# Altium footprint library MainFPs.PcbLib: 206 footprints (part 3 of 13)
Each footprint in its own frame and in the unit in brackets; x right, y up, seen from the top. Pads: shape width x height; smd on the part's side, far side on the other; paste and mask are expansions set on the pad; w line width, h text height; cw(c..) or ccw(c..) is an arc to the next point about the centre after c.
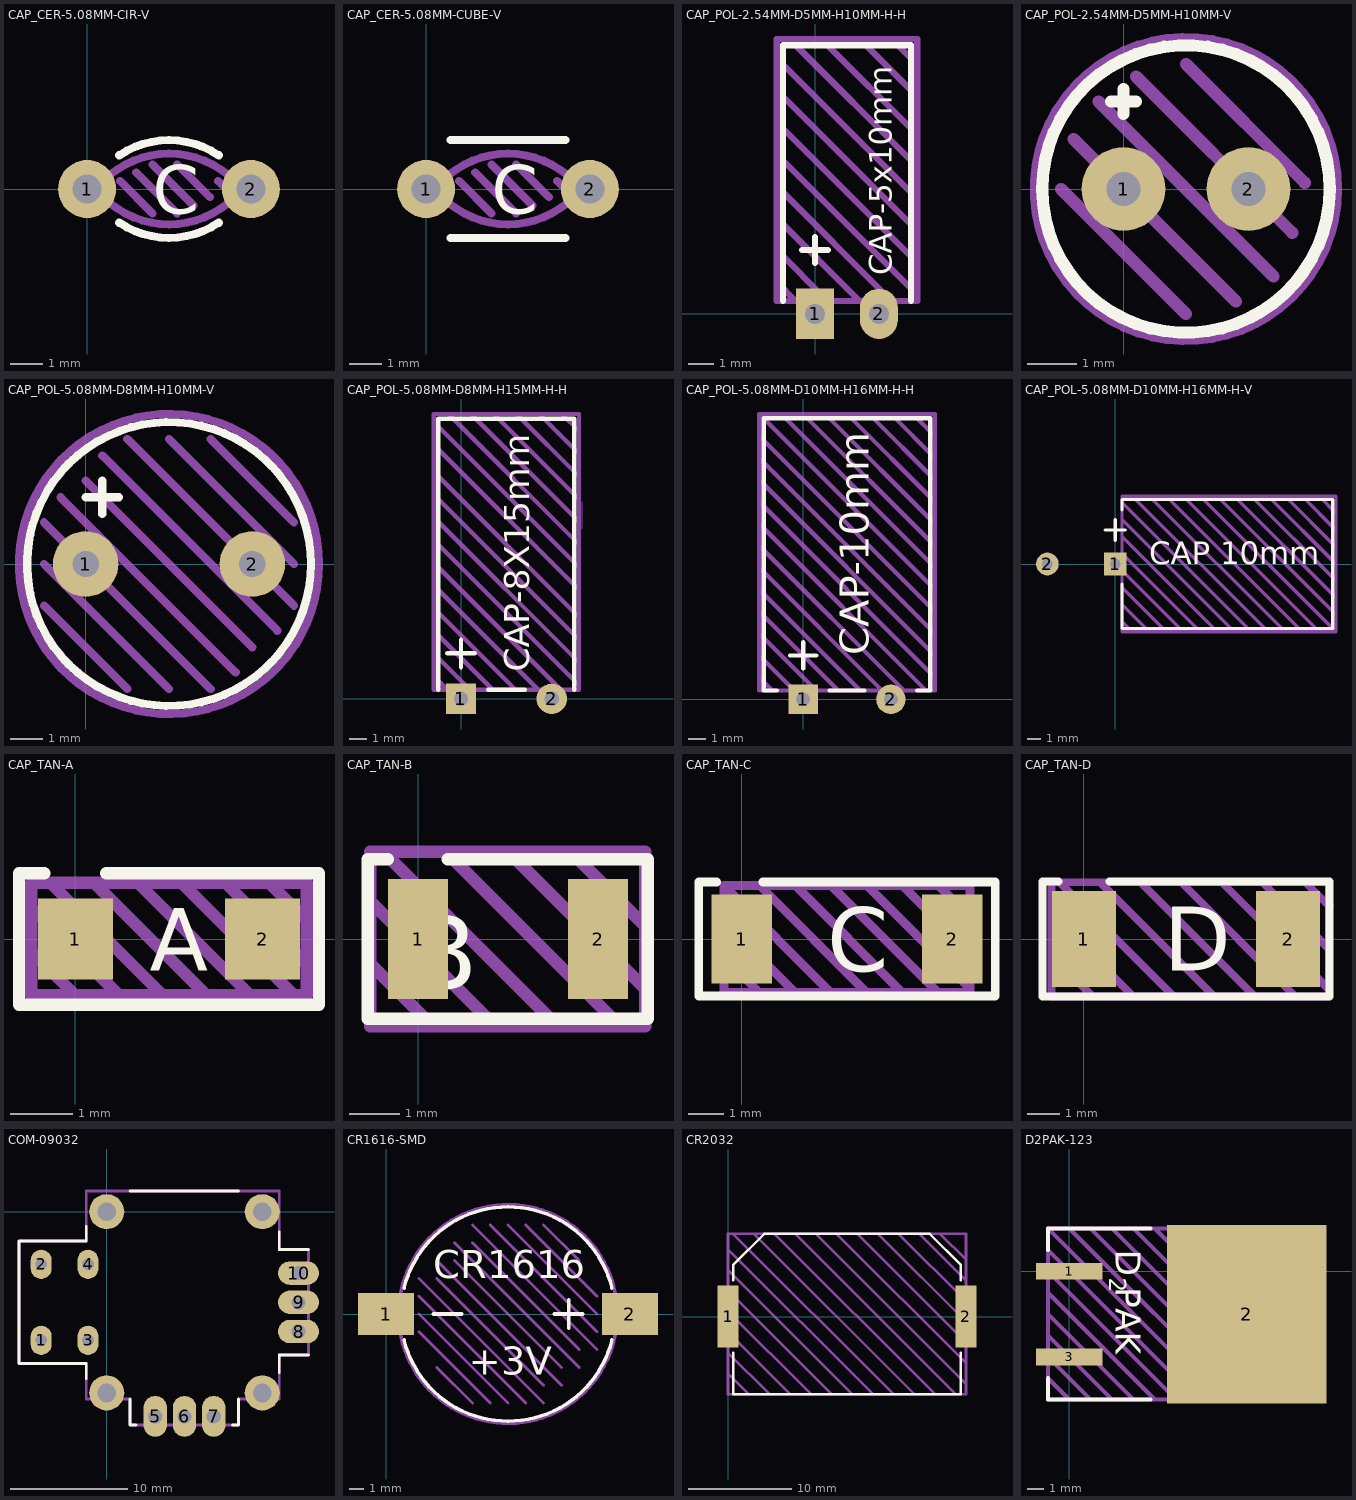
[diagram p2: the footprints below, top view; thin cyan lines are the x and y axes]

## CAP_CER-5.08MM-CIR-V [mm]
pads (2):
  round 1.8 hole 0.9: 1(0,0) 2(5.08,0)
Top Overlay:
  lines w0.25: 0.996,-1.046 ccw(c2.54,1.27) 4.084,-1.046 ; 0.996,1.046 cw(c2.54,-1.27) 4.084,1.046
  text "C" at 2.032,-0.762 h1.5
Draw:
  lines w0.25: 0.508,-0.254 ccw(c2.54,1.778) 4.572,-0.254 ; 0.508,0.254 cw(c2.54,-1.778) 4.572,0.254 ; 1.016,0.254 2.032,-0.762 ; 1.524,0.508 2.794,-0.762 ; 2.032,0.762 3.302,-0.508 ; 2.794,0.762 3.81,-0.254 ; 4.064,0.254 4.318,0
Info:
  text "'.Comment'" at -0.508,-2.54 h0.75
3D body: height 1.91, standoff 1.39, extent 3.841,-0.26 4.441,0.26
3D body: height 7.37, standoff 1.27, extent -0.508,-0.508 5.588,0.508
3D body: height 1.89, standoff -0.13, extent -0.232,-0.254 1.224,0.254
3D body: height 1.89, standoff -0.13, extent 3.856,-0.255 5.312,0.253
3D body: height 0, standoff -1.78, extent 4.825,-0.254 5.333,0.254
3D body: height 0, standoff -1.78, extent -0.254,-0.254 0.254,0.254
3D body: height 0.25, standoff -0.25, extent 4.825,-0.254 5.333,0.254
3D body: height 0.25, standoff -0.25, extent -0.266,-0.254 0.242,0.254
3D body: height 1.91, standoff 1.39, extent 0.639,-0.26 1.239,0.26

## CAP_CER-5.08MM-CUBE-V [mm]
pads (2):
  round 1.8 hole 0.9: 1(0,0) 2(5.08,0)
Top Overlay:
  lines w0.25: 0.762,-1.524 4.318,-1.524 ; 0.762,1.524 4.318,1.524
  text "C" at 2.032,-0.762 h1.5
Draw:
  lines w0.25: 0.508,-0.254 ccw(c2.54,1.778) 4.572,-0.254 ; 0.508,0.254 cw(c2.54,-1.778) 4.572,0.254 ; 1.016,0.254 2.032,-0.762 ; 1.524,0.508 2.794,-0.762 ; 2.032,0.762 3.302,-0.508 ; 2.794,0.762 3.81,-0.254 ; 4.064,0.254 4.318,0
Info:
  text "'.Comment'" at -0.381,-2.54 h0.75
3D body: height 3.8, standoff 3.3, extent 1.238,-0.261 1.758,0.259
3D body: height 3.8, standoff 3.3, extent 3.32,-0.26 3.84,0.26
3D body: height 6.17, standoff 3.63, extent 0.8,-0.64 4.28,0.66
3D body: height 4.23, standoff 2.73, extent 1.245,-0.255 1.753,0.253
3D body: height 4.23, standoff 2.73, extent 3.326,-0.254 3.834,0.254
3D body: height 0.25, standoff -0.25, extent -0.266,-0.254 0.242,0.254
3D body: height 0.25, standoff -0.25, extent 4.825,-0.254 5.333,0.254
3D body: height 0, standoff -1.78, extent -0.254,-0.254 0.254,0.254
3D body: height 0, standoff -1.78, extent 4.825,-0.254 5.333,0.254
3D body: height 2.83, standoff -0.12, extent 3.367,-0.255 5.314,0.253
3D body: height 2.83, standoff -0.12, extent -0.234,-0.254 1.713,0.254
3D body: height 2.98, standoff 2.48, extent 3.328,-0.254 3.836,0.254
3D body: height 2.98, standoff 2.48, extent 1.245,-0.255 1.753,0.253

## CAP_POL-2.54MM-D5MM-H10MM-H-H [mm]
pads (2):
  rect 1.5x2 hole 0.8: 1(0,0)
  oval 1.5x2 hole 0.8: 2(2.54,0)
Top Overlay:
  lines w0.25: -1.27,0.508 -1.27,10.668 3.81,10.668 3.81,0.508 ; -0.508,2.54 0.508,2.54 ; 0,2.032 0,3.048
  text "CAP-5x10mm" at 3.048,1.524 h0.9
Draw:
  lines w0.25: -1.524,1.27 -0.762,0.508 ; -1.524,2.54 0.508,0.508 ; -1.524,3.81 1.778,0.508 ; -1.524,5.08 3.048,0.508 ; -1.524,6.35 4.064,0.762 ; -1.524,7.62 4.064,2.032 ; -1.524,8.89 4.064,3.302 ; -1.524,10.16 4.064,4.572 ; -1.016,10.922 4.064,5.842 ; -0.508,0.508 0.762,0.508 ; 0.254,10.922 4.064,7.112 ; 1.778,10.922 4.064,8.636 4.064,8.128 ; 2.032,0.508 3.81,0.508 ; 2.54,0.508 0.762,0.508 ; 3.048,10.922 4.064,9.906 ; 3.302,0.508 4.064,0.508 4.064,10.922 -1.524,10.922 -1.524,0.508 0.762,0.508
Info:
  text "'.Comment'" at -1.651,-2.413 h1
3D body: height 3.33, standoff 1.67, extent 3.344,10.453 3.86,10.953
3D body: height 5, standoff 0, extent -1.187,0.668 3.813,1.168
3D body: height 4.9, standoff 0.1, extent -1.087,10.812 3.713,10.842
3D body: height 5.01, standoff -0.01, extent -1.197,10.45 3.823,10.95
3D body: height 5, standoff 0, extent -1.187,10.812 3.813,10.912
3D body: height 2.75, standoff 2.25, extent 3.911,7.112 3.952,10.112
3D body: height 2.75, standoff 2.25, extent -0.254,0 0.254,1.27
3D body: height 5.01, standoff -0.01, extent -1.197,0.842 3.823,10.812
3D body: height 2.5, standoff -1.78, extent 2.286,-0.254 2.794,0.254
3D body: height 2.5, standoff -1.78, extent -0.254,-0.254 0.254,0.254
3D body: height 2.75, standoff 2.25, extent 2.286,-0.254 2.794,0.254
3D body: height 2.75, standoff 2.25, extent -0.254,-0.254 0.254,0.254
3D body: height 2.75, standoff 2.25, extent 2.286,0 2.794,1.27
3D body: height 2.75, standoff 2.25, extent 3.911,1.93 3.952,4.93
3D body: height 2.5, standoff 0.48, extent 1.231,0.75 3.132,1.25
3D body: height 4.52, standoff 2.5, extent 1.231,0.75 3.132,1.25
3D body: height 4.52, standoff 2.5, extent -0.587,0.75 1.313,1.25
3D body: height 2.5, standoff 0.48, extent -0.587,0.75 1.313,1.25
3D body: height 3.34, standoff 1.66, extent 3.691,0.66 3.844,10.66
3D body: height 3.33, standoff 1.67, extent 3.327,0.66 3.844,0.86

## CAP_POL-2.54MM-D5MM-H10MM-V [mm]
pads (2):
  round 1.7 hole 0.7: 1(0,0) 2(2.54,0)
Top Overlay:
  circle w0.25: c1.27,0 r2.921
  lines w0.25: -0.254,1.778 0.254,1.778 ; 0,1.524 0,2.032
Draw:
  circle w0.25: c1.27,0 r3.048
  lines w0.25: -1.27,0 1.27,-2.54 ; -1.016,1.016 2.286,-2.286 ; -0.508,1.778 3.048,-1.778 ; 0.254,2.286 3.429,-0.889 ; 1.27,2.54 3.683,0.127
Info:
  text "'.Comment'" at -2.032,-4.318 h1
3D body: height 10.97, standoff 10.9, extent -1.03,-2.3 3.57,2.3
3D body: height 10.92, standoff 0.89, extent 3.81,-0.762 3.836,0.762
3D body: height 10.92, standoff 0.76, extent -1.27,-2.54 3.81,2.54
3D body: height 0.79, standoff -1.78, extent 2.286,-0.254 2.794,0.254
3D body: height 0.79, standoff -1.78, extent -0.254,-0.254 0.254,0.254
3D body: height 10.16, standoff 8.89, extent 3.848,-0.127 3.874,0.127
3D body: height 5.08, standoff 3.81, extent 3.848,-0.127 3.874,0.127
3D body: height 7.62, standoff 6.35, extent 3.848,-0.127 3.874,0.127
3D body: height 2.54, standoff 1.27, extent 3.848,-0.127 3.874,0.127
3D body: height 11, standoff 10.95, extent -1.016,-2.286 3.556,2.286

## CAP_POL-5.08MM-D8MM-H10MM-V [mm]
pads (2):
  round 2 hole 0.8: 1(0,0) 2(5.08,0)
Top Overlay:
  circle w0.25: c2.54,0 r4.325
  lines w0.25: 0.508,2.54 0.508,1.524 0.508,2.032 0,2.032 1.016,2.032
Draw:
  circle w0.25: c2.54,0 r4.572
  lines w0.25: -1.27,-1.27 1.27,-3.81 ; -1.27,0 2.54,-3.81 ; -1.27,1.27 3.81,-3.81 ; -0.762,2.032 4.572,-3.302 ; 0,2.54 5.08,-2.54 ; 0.508,3.302 5.842,-2.032 ; 1.27,3.81 6.35,-1.27 ; 2.54,3.81 6.35,0 ; 3.81,3.81 6.35,1.27
Info:
  text "'.Comment'" at -1.778,-5.715 h1
3D body: height 2.54, standoff 1.27, extent 6.642,-0.127 6.668,0.127
3D body: height 7.62, standoff 6.35, extent 6.642,-0.127 6.668,0.127
3D body: height 5.08, standoff 3.81, extent 6.642,-0.127 6.668,0.127
3D body: height 12.7, standoff 11.43, extent 6.642,-0.127 6.668,0.127
3D body: height 10.16, standoff 8.89, extent 6.642,-0.127 6.668,0.127
3D body: height 0.79, standoff -1.78, extent -0.254,-0.254 0.254,0.254
3D body: height 0.79, standoff -1.78, extent 4.826,-0.254 5.334,0.254
3D body: height 13.61, standoff 13.56, extent -1.143,-3.683 6.223,3.683
3D body: height 13.46, standoff 0.76, extent -1.524,-4.064 6.604,4.064
3D body: height 13.33, standoff 0.89, extent 6.604,-1.016 6.629,1.016
3D body: height 13.59, standoff 13.44, extent -1.143,-3.683 6.223,3.683

## CAP_POL-5.08MM-D8MM-H15MM-H-H [mm]
pads (2):
  rect 1.7x1.7 hole 0.8: 1(0,0)
  round 1.7 hole 0.8: 2(5.08,0)
Top Overlay:
  lines w0.25: -1.27,0.508 -1.27,15.686 6.35,15.686 6.35,0.508 ; -0.762,2.54 0.762,2.54 ; 0,1.778 0,2.54 0,3.302 ; 1.524,0.508 3.556,0.508
  text "CAP-8X15mm" at 3.81,1.524 h1.4
Draw:
  lines w0.025: 6.785,9.529 6.785,11.03
  lines w0.25: -1.524,1.27 -0.762,0.508 ; -1.524,2.54 0.508,0.508 ; -1.524,3.81 1.778,0.508 ; -1.524,5.08 3.048,0.508 ; -1.524,6.35 4.318,0.508 ; -1.524,7.62 5.588,0.508 ; -1.524,8.89 6.604,0.762 ; -1.524,10.16 6.604,2.032 ; -1.524,11.43 6.604,3.302 ; -1.524,12.7 6.604,4.572 ; -1.493,14.193 6.604,6.096 ; -1.493,15.463 6.604,7.366 ; -0.666,15.906 6.604,8.636 ; -0.508,0.508 0.762,0.508 ; 0.604,15.906 6.604,9.906 ; 1.874,15.906 6.604,11.176 ; 2.032,0.508 3.81,0.508 ; 2.54,0.508 0.762,0.508 ; 3.302,0.508 6.604,0.508 ; 4.38,15.94 6.604,13.716 ; 4.572,0.508 6.604,0.508 ; 5.684,15.906 6.604,14.986 ; 0.762,0.508 -1.524,0.508 -1.524,15.94 6.604,15.94 6.604,0.508 ; 3.144,15.906 6.604,12.446 3.144,15.906
Info:
  text "'.Comment'" at -1.521,-2.602 h1.25
3D body: height 8, standoff 0, extent -1.46,0.588 6.54,15.588
3D body: height 6.53, standoff 1.47, extent 5.65,0.59 6.55,15.54
3D body: height 4.2, standoff 3.8, extent 6.525,6.003 6.575,9.503
3D body: height 7.7, standoff 3.7, extent 2.54,0.438 5.818,0.738
3D body: height 7.7, standoff 3.7, extent -0.738,0.438 2.54,0.738
3D body: height 4.3, standoff 0.3, extent 2.54,0.438 5.818,0.738
3D body: height 4.3, standoff 0.3, extent -0.738,0.438 2.54,0.738
3D body: height 7.9, standoff 0.1, extent -1.36,15.495 6.44,15.595
3D body: height 7.6, standoff 0.4, extent -1.06,15.41 6.14,15.71
3D body: height 8, standoff 0, extent -1.46,15.25 6.54,15.75
3D body: height 6.54, standoff 1.46, extent 4.729,15.475 6.551,15.775
3D body: height 6.54, standoff 1.46, extent 4.728,0.325 6.55,0.625
3D body: height 4.3, standoff 3.7, extent 4.781,-0.047 5.381,1.223
3D body: height 4.3, standoff 3.7, extent -0.3,-0.3 0.3,0.3
3D body: height 4.3, standoff 3.7, extent 4.78,-0.3 5.38,0.3
3D body: height 4, standoff -1.78, extent -0.3,-0.3 0.3,0.3
3D body: height 4, standoff -1.78, extent 4.78,-0.3 5.38,0.3
3D body: height 4.3, standoff 3.7, extent -0.3,0 0.3,1.27
3D body: height 4.2, standoff 3.8, extent 6.525,1.005 6.575,4.505
3D body: height 8, standoff 0, extent -1.469,0.35 6.531,0.85
3D body: height 4.2, standoff 3.8, extent 6.525,11.033 6.575,14.533

## CAP_POL-5.08MM-D10MM-H16MM-H-H [mm]
pads (2):
  rect 1.7x1.7 hole 0.8: 1(0,0)
  round 1.7 hole 0.8: 2(5.08,0)
Top Overlay:
  lines w0.25: -1.524,0.508 -2.286,0.508 -2.286,16.256 7.366,16.256 7.366,0.508 6.604,0.508 ; -0.762,2.54 0.762,2.54 ; 0,1.778 0,2.54 0,3.302 ; 1.524,0.508 3.556,0.508
  text "CAP-10mm" at 3.81,2.54 h1.7
Draw:
  lines w0.25: -2.54,1.27 -1.778,0.508 0,0.508 -0.508,0.508 -2.54,2.54 ; -2.54,3.81 0.762,0.508 2.54,0.508 ; -2.54,5.08 2.032,0.508 3.81,0.508 ; -2.54,6.35 3.302,0.508 5.08,0.508 4.572,0.508 -2.54,7.62 ; -2.54,8.89 5.842,0.508 7.62,0.508 ; -2.54,10.16 7.112,0.508 7.62,0.508 ; -2.54,11.43 7.62,1.27 7.62,0.508 ; -2.54,12.7 7.62,2.54 ; -2.54,13.97 7.62,3.81 7.62,5.08 -2.54,15.24 ; -1.27,16.51 7.62,7.62 ; 0,16.51 7.62,8.89 7.62,6.35 ; 1.27,16.51 7.62,10.16 ; 2.54,16.51 7.62,11.43 7.62,12.7 3.81,16.51 ; 5.08,16.51 7.62,13.97 ; 6.35,16.51 7.62,15.24 ; 7.62,6.985 7.62,7.62 ; -2.54,16.51 7.62,6.35 ; -2.54,16.51 -2.54,0.508 7.62,0.508 ; -2.54,16.51 7.62,16.51 7.62,16.256 7.62,0.508 ; 7.62,6.35 7.62,7.62
Info:
  text "'.Comment'" at -2.286,-2.54 h1.25
3D body: height 5.2, standoff 4.8, extent 7.595,3.81 7.645,8.89
3D body: height 5.2, standoff 4.8, extent 7.595,0.508 7.645,2.54
3D body: height 9, standoff 1, extent 2.24,16.18 2.84,16.28
3D body: height 5.3, standoff 4.7, extent -1.524,16.231 6.604,16.281
3D body: height 7, standoff 3, extent 6.604,0.508 7.62,0.635
3D body: height 7, standoff 3, extent 7.366,0.588 7.62,16.002
3D body: height 5.25, standoff 4.75, extent -0.253,0 0.255,1.27
3D body: height 10, standoff 0, extent -2.46,0.588 7.54,16.088
3D body: height 5, standoff -1.78, extent 4.826,-0.254 5.334,0.254
3D body: height 5, standoff -1.78, extent -0.254,-0.254 0.254,0.254
3D body: height 5.25, standoff 4.75, extent 4.826,-0.254 5.334,0.254
3D body: height 5.25, standoff 4.75, extent -0.254,-0.254 0.254,0.254
3D body: height 5.25, standoff 4.75, extent 4.827,-0.047 5.335,1.223
3D body: height 9.5, standoff 0.5, extent -1.96,16.002 7.04,16.256
3D body: height 5.2, standoff 4.8, extent 7.595,10.16 7.645,15.24
3D body: height 5.2, standoff 4.8, extent 6.858,0.483 7.645,0.533
3D body: height 9, standoff 1, extent -1.46,0.483 6.54,0.783

## CAP_POL-5.08MM-D10MM-H16MM-H-V [mm]
pads (2):
  rect 1.7x1.7 hole 0.8: 1(0,0)
  round 1.7 hole 0.8: 2(-5.08,0)
Top Overlay:
  lines w0.25: -0.762,2.54 0,2.54 0.762,2.54 ; 0,1.778 0,3.302 ; 0.508,-1.524 0.508,-4.826 16.256,-4.826 16.256,4.826 0.508,4.826 0.508,4.064
  text "CAP 10mm" at 2.54,0 h1.7
Draw:
  lines w0.25: 0.508,0 0.508,-1.778 3.81,-5.08 ; 0.508,1.27 0.508,-0.508 5.08,-5.08 ; 1.27,-5.08 0.508,-4.318 0.508,-2.54 0.508,-3.048 2.54,-5.08 ; 2.54,5.08 12.7,-5.08 ; 6.35,-5.08 0.508,0.762 0.508,2.54 0.508,2.032 7.62,-5.08 ; 6.985,5.08 7.62,5.08 ; 8.89,-5.08 0.508,3.302 0.508,5.08 ; 10.16,-5.08 0.508,4.572 0.508,5.08 ; 10.16,5.08 16.51,-1.27 ; 11.43,-5.08 1.27,5.08 0.508,5.08 ; 13.97,-5.08 3.81,5.08 5.08,5.08 15.24,-5.08 ; 13.97,5.08 16.51,2.54 ; 15.24,5.08 16.51,3.81 ; 16.51,-3.81 7.62,5.08 ; 16.51,-2.54 8.89,5.08 6.35,5.08 ; 16.51,0 11.43,5.08 12.7,5.08 16.51,1.27 ; 0.508,5.08 0.508,-5.08 16.51,-5.08 ; 0.508,5.08 16.256,5.08 16.51,5.08 16.51,-5.08 ; 6.35,5.08 16.51,-5.08 ; 6.35,5.08 7.62,5.08
Info:
  text "'.Comment'" at 0.635,-6.858 h1.25
3D body: height 9, standoff 1, extent 0.62,-4 0.92,4
3D body: height 5.2, standoff 4.8, extent 0.657,4.318 0.707,5.106
3D body: height 5.2, standoff 4.8, extent 10.334,5.055 15.414,5.106
3D body: height 9.5, standoff 0.5, extent 16.176,-4.5 16.43,4.5
3D body: height 2.71, standoff 2.21, extent -0.047,-0.253 1.223,0.255
3D body: height 7.75, standoff 7.25, extent -5.334,-0.253 -4.826,0.255
3D body: height 2.71, standoff 2.21, extent -0.254,-0.254 0.254,0.254
3D body: height 7.54, standoff -1.78, extent -5.334,-0.253 -4.826,0.255
3D body: height 2.46, standoff -1.78, extent -0.254,-0.254 0.254,0.254
3D body: height 10, standoff 0, extent 0.762,-5 16.262,5
3D body: height 7.75, standoff 7.25, extent -5.08,-0.253 0.92,0.255
3D body: height 7, standoff 3, extent 0.762,4.826 16.176,5.08
3D body: height 7, standoff 3, extent 0.682,3.81 0.809,5.08
3D body: height 5.3, standoff 4.7, extent 16.405,-4.064 16.455,4.064
3D body: height 9, standoff 1, extent 16.354,-0.3 16.454,0.3
3D body: height 5.2, standoff 4.8, extent 0.682,5.055 2.714,5.106
3D body: height 5.2, standoff 4.8, extent 3.984,5.055 9.064,5.106

## CAP_TAN-A [mm]
pads (2):
  rect 1.2x1.3 smd: 1(0,0) 2(3,0)
Top Overlay:
  lines w0.2: -0.5,1.05 -0.9,1.05 -0.9,-1.05 3.9,-1.05 3.9,0.65 3.9,1.05 0.5,1.05
  text "A" at 1.194,-0.508 h1
Draw:
  lines w0.2: -0.7,-0.2 0,-0.9 0.2,-0.9 ; -0.7,0.5 0.7,-0.9 ; -0.4,0.9 1.4,-0.9 1.5,-0.9 ; 0.3,0.9 2.1,-0.9 ; 1,0.9 2.8,-0.9 ; 1.7,0.9 3.5,-0.9 ; 2.4,0.9 3.7,-0.4 ; 3.1,0.9 3.7,0.3 ; -0.7,-0.9 3.7,-0.9 3.7,0.9 -0.7,0.9 -0.7,-0.9
Info:
  text "'.Comment'" at -0.889,-2.159 h0.75
3D body: height 0.8, standoff 0.05, extent -0.1,-0.625 -0.075,0.625
3D body: height 0.8, standoff 0.05, extent 3.125,-0.6 3.15,0.6
3D body: height 0.05, standoff 0, extent 2.326,-0.6 3.15,0.6
3D body: height 0.05, standoff 0, extent -0.1,-0.625 0.725,0.625
3D body: height 1.6, standoff 0.05, extent -0.075,-0.85 0.925,0.85
3D body: height 1.6, standoff 0.05, extent 0.925,-0.85 3.125,0.85

## CAP_TAN-B [mm]
pads (2):
  rect 1.2x2.4 smd: 1(0,0) 2(3.6,0)
Top Overlay:
  lines w0.25: -0.6,1.6 -1,1.6 -1,-1.6 4.6,-1.6 4.6,1.6 0.6,1.6
  text "B" at -0.208,-1.016 h1.5
Draw:
  lines w0.25: -0.95,-0.5 0.3,-1.75 ; -0.95,0.75 1.55,-1.75 1.8,-1.75 ; -0.7,1.75 2.8,-1.75 3.05,-1.75 ; 0.55,1.75 4.05,-1.75 ; 1.8,1.75 4.55,-1 4.55,-1.75 ; 3.05,1.75 4.55,0.25 4.55,0 ; 4.55,-1.75 -0.95,-1.75 -0.95,1.75 4.55,1.75 4.55,-1.75
Info:
  text "'.Comment'" at -0.97,-3.175 h1
3D body: height 0.8, standoff 0.05, extent -0.056,-1.15 -0.031,1.15
3D body: height 1.7, standoff 0.05, extent -0.031,-1.5 1.244,1.5
3D body: height 1.7, standoff 0.05, extent 1.244,-1.5 3.619,1.5
3D body: height 0.05, standoff 0, extent -0.056,-1.15 0.856,1.15
3D body: height 0.05, standoff 0, extent 2.731,-1.15 3.644,1.15
3D body: height 0.8, standoff 0.05, extent 3.619,-1.15 3.644,1.15

## CAP_TAN-C [mm]
pads (2):
  rect 1.7x2.5 smd: 1(0,0) 2(5.9,0)
Top Overlay:
  lines w0.25: -0.7,1.6 -1.2,1.6 -1.2,-1.6 7.1,-1.6 7.1,1.6 0.6,1.6
  text "C" at 2.4,-0.9 h1.8
Draw:
  lines w0.25: -0.5,-0.5 0.5,-1.5 ; -0.5,0.5 1.5,-1.5 1.6,-1.5 ; 0.5,1.5 3.5,-1.5 3.8,-1.5 ; 1.5,1.5 4.5,-1.5 4.6,-1.5 4.4,-1.5 ; 2.5,-1.5 -0.5,1.5 ; 2.5,1.5 5.5,-1.5 5.6,-1.5 ; 3.5,1.5 6.4,-1.4 6.4,-1.5 ; 4.5,1.5 6.4,-0.4 6.4,-1.1 ; 5.5,1.5 6.4,0.6 6.4,0.2 ; -0.5,1.5 6.4,1.5 6.4,-1.5 ; -0.5,1.5 -0.5,-1.5 6.4,-1.5
Info:
  text "'.Comment'" at -1.143,-3.048 h1
3D body: height 1, standoff 0.05, extent -0.2,-1.15 -0.075,1.15
3D body: height 0.05, standoff 0, extent -0.2,-1.15 0.9,1.15
3D body: height 0.05, standoff 0, extent 5,-1.15 6.1,1.15
3D body: height 1, standoff 0.05, extent 5.975,-1.15 6.1,1.15
3D body: height 1.7, standoff 0.05, extent -0.075,-1.6 1.3,1.7
3D body: height 1.7, standoff 0.05, extent 1.3,-1.6 5.975,1.7

## CAP_TAN-D [mm]
pads (2):
  rect 2x3 smd: 1(0,0) 2(6.4,0)
Top Overlay:
  lines w0.25: -0.8,1.8 -1.3,1.8 -1.3,-1.8 7.7,-1.8 7.7,1.8 0.8,1.8
  text "D" at 2.5,-1 h2
Draw:
  lines w0.25: -1.016,-0.508 0.276,-1.8 0.508,-1.8 ; -1.016,0.762 1.546,-1.8 1.778,-1.8 ; -0.762,1.778 2.794,-1.778 ; 0.508,1.778 4.086,-1.8 4.318,-1.8 ; 1.778,1.778 5.334,-1.778 ; 3.048,1.778 6.626,-1.8 7.112,-1.8 ; 4.318,1.778 7.678,-1.582 ; 5.588,1.778 7.678,-0.312 ; 6.604,1.778 6.938,1.778 7.689,1.027 ; 7.678,-1.582 7.678,1.778 -1.016,1.778 -1.016,-1.778 -0.994,-1.8 7.656,-1.8 7.678,-1.778 7.678,-1.582
Info:
  text "'.Comment'" at -1.27,-3.302 h1
3D body: height 1.8, standoff 0.05, extent 6.5,-1.15 6.6,1.15
3D body: height 0.05, standoff 0, extent 5.631,-1.15 6.6,1.15
3D body: height 2.9, standoff 0.05, extent 1.5,-1.5 6.5,1.5
3D body: height 2.9, standoff 0.05, extent -0.1,-1.5 1.5,1.5
3D body: height 0.05, standoff 0, extent -0.2,-1.15 0.769,1.15
3D body: height 1.8, standoff 0.05, extent -0.2,-1.15 -0.1,1.15

## COM-09032 [mm] "PS3/PS4 Analog Joystick"
pads (14):
  oval 1.8x2.5 hole 1: 1(-5.6,-11) 2(-5.6,-4.5) 3(-1.6,-11) 4(-1.6,-4.5)
  oval 2x3.5 hole 1.2: 5(4.15,-17.5) 6(6.65,-17.5) 7(9.15,-17.5)
  oval 3.5x2 hole 1.2: 8(16.4,-10.25) 9(16.4,-7.75) 10(16.4,-5.25)
  round 3 hole 1.6: ""(0,-15.5) ""(0,0) ""(13.3,-15.5) ""(13.3,0)
Top Overlay:
  lines w0.25: -1.75,-14.25 -1.75,-13 -7.5,-13 -7.5,-2.5 -1.75,-2.5 -1.75,-1.25 ; 2,-16 2,-18.25 2.5,-18.25 ; 2,1.75 11.25,1.75 ; 10.75,-18.25 11.25,-18.25 11.25,-16 ; 14.75,-13.75 14.75,-12.25 17.25,-12.25 ; 14.75,-1.75 14.75,-3.25 17.25,-3.25
Draw:
  lines w0.25: -7.5,-13 -7.5,-2.5 -1.75,-2.5 -1.75,1.75 2,1.75 14.75,1.75 14.75,-3.25 17.25,-3.25 17.25,-12.25 14.75,-12.25 14.75,-16 11.25,-16 11.25,-18.25 2,-18.25 2,-16 -1.75,-16 -1.75,-13 -7.5,-13
Info:
  text "'.Comment'" at -1.5,-22 h2

## CR1616-SMD [mm]
pads (2):
  rect 4x3 smd: 1(0,0) 2(17.4,0)
Top Overlay:
  lines w0.25: 1.282,-1.855 ccw(c8.7,0) 16.118,-1.855 ; 1.282,1.855 cw(c8.7,0) 16.118,1.855 ; 3.366,0 5.398,0 ; 12.002,0 14.034,0 ; 13.018,-1.016 13.018,1.016
  text "+3V" at 5.906,-4.318 h2
  text "CR1616" at 3.366,2.54 h2
Draw:
  circle w0.25: c8.7,0 r7.8
  lines w0.2: 2.35,-1.27 7.43,-6.35 ; 2.35,0 8.7,-6.35 ; 2.35,1.27 9.97,-6.35 ; 2.35,2.54 11.24,-6.35 ; 3.62,-3.81 6.16,-6.35 ; 3.62,2.54 11.24,-5.08 ; 3.62,3.81 12.51,-5.08 ; 4.89,3.81 12.51,-3.81 ; 4.89,5.08 13.78,-3.81 ; 6.16,5.08 13.78,-2.54 ; 6.16,6.35 15.05,-2.54 ; 7.43,6.35 15.05,-1.27 ; 8.7,6.35 15.05,0 ; 9.97,6.35 15.05,1.27 ; 11.24,6.35 13.78,3.81
Info:
  text "'.Comment'" at 0.445,-10.16 h2

## CR2032 [mm] "Battery Holder Compact"
pads (2):
  rect 2x6 smd: 1(0,0) 2(23,0)
Top Overlay:
  lines w0.25: 0.5,-3.5 0.5,-7.5 22.5,-7.5 22.5,-3.5 ; 0.5,3.5 0.5,5 ; 22.5,3.5 22.5,5 19.5,8 3.5,8 0.5,5 ; 0.5,5 0.5,5
Draw:
  lines w0.25: 0,-5.5 2,-7.5 ; 0,-3.5 4,-7.5 ; 0,-1.5 6,-7.5 ; 0,0.5 8,-7.5 ; 0,2.5 10,-7.5 ; 0,4.5 12,-7.5 ; 0,6.5 14,-7.5 ; 0.5,8 16,-7.5 ; 2.5,8 18,-7.5 ; 4.5,8 20,-7.5 ; 6.5,8 22,-7.5 ; 8.5,8 23,-6.5 ; 10.5,8 23,-4.5 ; 12.5,8 23,-2.5 ; 14.5,8 23,-0.5 ; 16.5,8 23,1.5 ; 18.5,8 23,3.5 ; 20.5,8 23,5.5 ; 0,-7.5 23,-7.5 23,8 0,8 0,-7.5
Info:
  text "'.Comment'" at 4.827,-10.175 h1.5
3D body "CR2032_Holder.STEP": height 4.35, standoff 0.05, extent 0.05,-7.625 22.95,7.888

## D2PAK-123 [mm]
height 4.6
pads (3):
  rect 3.95x1 smd: 1(0,0) 3(0,-5.08)
  rect 9.5x10.6 smd: 2(10.541,-2.54)
Top Overlay:
  lines w0.25: -1.27,-6.35 -1.27,-7.62 4.826,-7.62 ; -1.27,1.27 -1.27,2.54 4.826,2.54
  text "2" at 2.379,-0.383 h1
  text "D PAK" at 2.762,1.27 h1.5
Draw:
  lines w0.25: -1.27,-6.35 0,-7.62 ; -1.27,-5.08 1.27,-7.62 ; -1.27,-3.81 2.54,-7.62 ; -1.27,-2.54 3.81,-7.62 ; -1.27,-1.27 5.08,-7.62 ; -1.27,0 6.35,-7.62 ; -1.27,1.27 7.62,-7.62 ; 0,2.54 10.16,-7.62 ; 1.27,2.54 11.43,-7.62 ; 2.54,2.54 12.7,-7.62 ; 3.81,2.54 13.97,-7.62 ; 5.08,2.54 14.097,-6.477 ; 6.35,2.54 14.097,-5.207 ; 7.62,2.54 14.097,-3.937 ; 8.89,-7.62 -1.27,2.54 ; 8.89,2.54 14.097,-2.667 ; 10.16,2.54 14.097,-1.397 ; 11.43,2.54 14.097,-0.127 ; 12.7,2.54 14.097,1.143 ; -1.27,2.54 14.097,2.54 14.097,-7.62 -1.27,-7.62 -1.27,2.54
Info:
  text "'.Comment'" at 1.297,-9.869 h1.25
3D body "D2PAK.step": height 4.7, standoff 0, extent -1.329,-7.69 14.096,2.61